# Altium footprint library PowerModule.PcbLib: 47 footprints (part 2 of 3)
Each footprint in its own frame and in the unit in brackets; x right, y up, seen from the top. Pads: shape width x height; smd on the part's side, far side on the other; paste and mask are expansions set on the pad; w line width, h text height; cw(c..) or ccw(c..) is an arc to the next point about the centre after c.
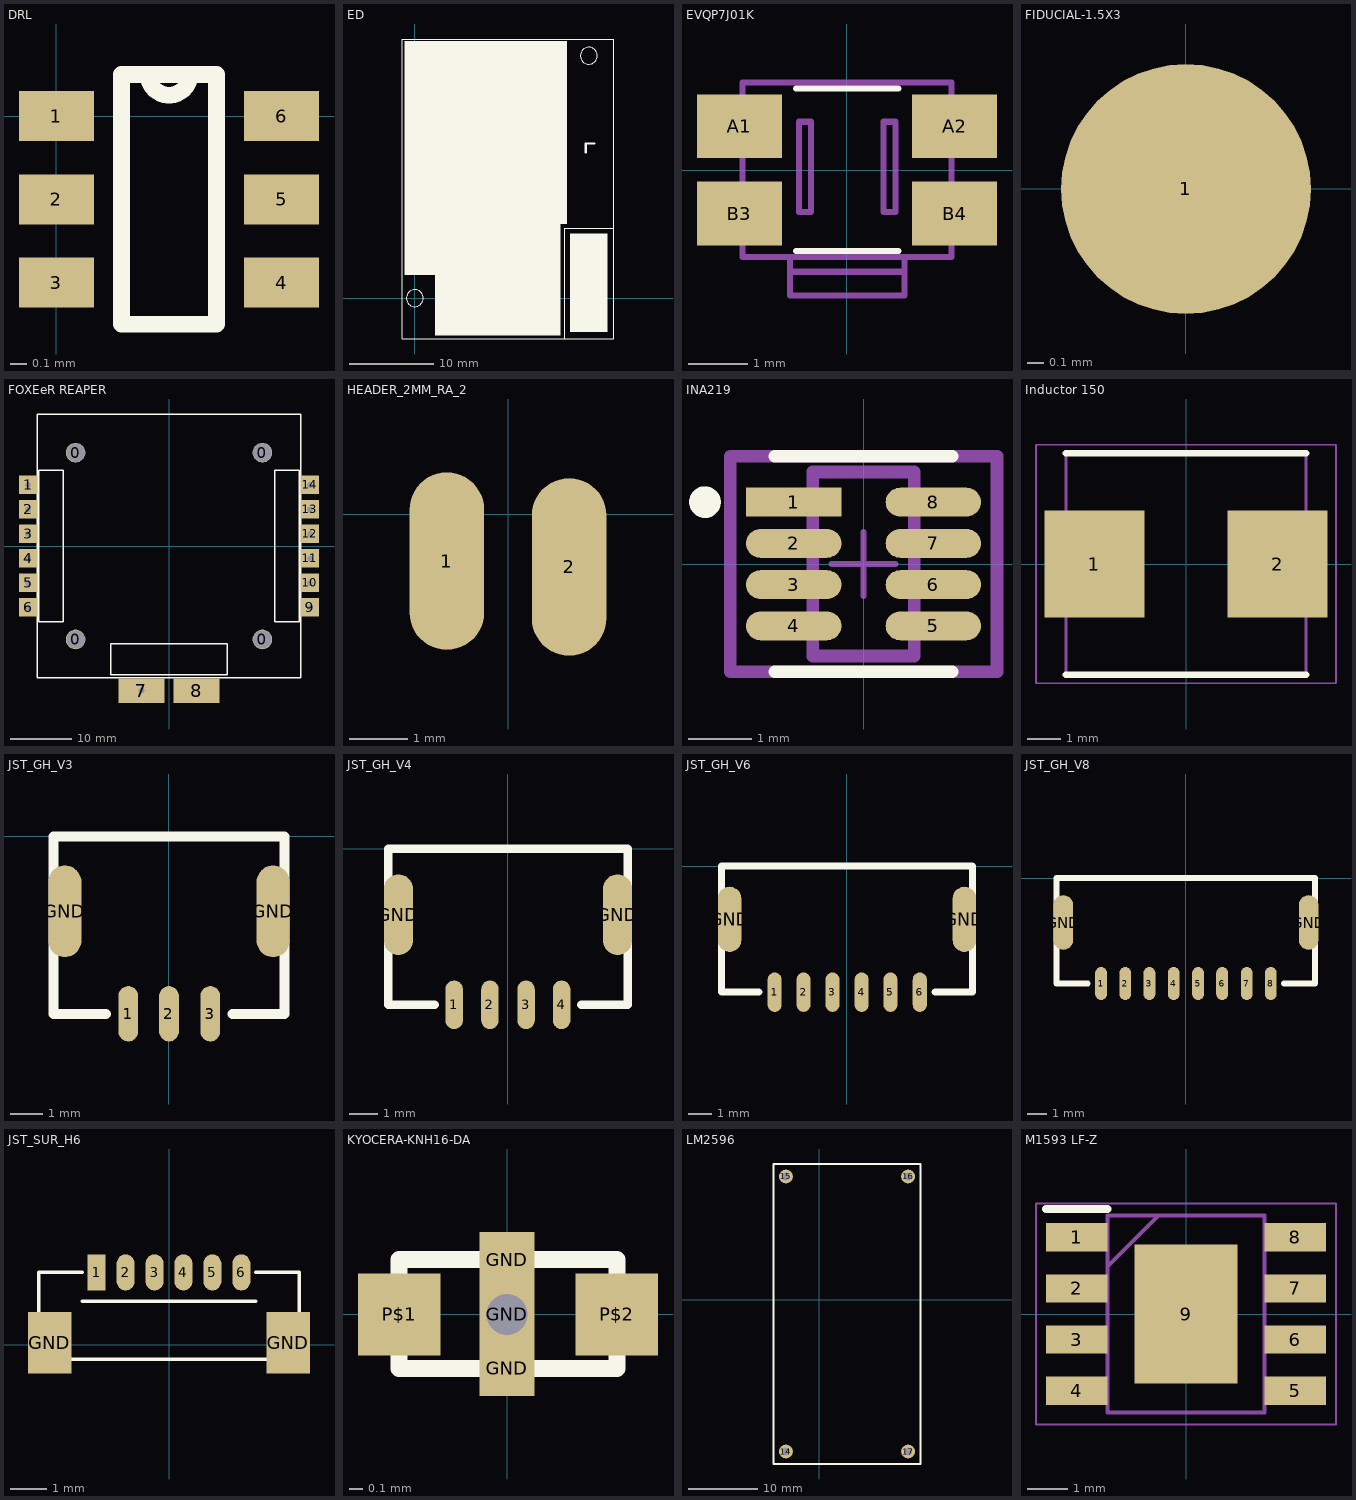
[diagram p1: the footprints below, top view; thin cyan lines are the x and y axes]

## DRL [mm]
pads (6):
  rect 0.45x0.3 smd: 1(0,0) 2(0,-0.5) 3(0,-1) 4(1.35,-1) 5(1.35,-0.5) 6(1.35,0)
Top Overlay:
  lines w0.1: 0.39,-1.25 0.96,-1.25 0.96,0.25 0.55,0.25 ccw(c0.675,0.25) 0.8,0.25 0.39,0.25 0.39,-1.25
3D body: height 0.6, standoff -0.05, extent 0.4,-1.2 1,0.2

## ED [mil]
Top Overlay:
  circle w3.94: c811.02,1129.53 r39.37
  circle w3.94: c0,0 r39.37
  region: -47.24,1196.85 -47.24,110.24 94.49,110.24 94.49,-173.23 677.17,-173.23 677.17,346.46 708.66,346.46 708.66,1196.85
  region: 724.41,299.21 897.64,299.21 897.64,-157.48 724.41,-157.48
  lines w3.94: 698.82,-190.16 698.82,325.98 922.36,325.98 ; -57.87,-190.16 926.38,-190.16 926.38,1207.48 -57.87,1207.48 -57.87,-190.16
  lines w10: 796.46,678.54 796.46,720.47 835.83,720.47

## EVQP7J01K [mil]
pads (4):
  rect 56x42 smd: A1(-70.87,29) A2(71,29) B3(-70.87,-28.54) B4(71,-28.54)
Top Overlay:
  lines w4: -82.68,20 -82.68,24 ; -33.46,-53.15 34,-53.15 ; -33.46,54 34,54
Mechanical 16:
  lines w4: -82.68,20 -70.87,20 ; -82.68,24 -90.55,24 -90.55,40 -70.87,40 ; -70.87,-39.37 -90.55,-39.37 -90.55,-23.62 -82.68,-23.62 -82.68,-19.68 -70.87,-19.68 ; 38,-66.93 -37.4,-66.93 ; 71,-39.37 91,-39.37 91,-23.62 83,-23.62 83,-19.68 71,-19.68 ; 71,20 83,20 83,24 91,24 91,40 71,40 ; -37.4,-66.93 -37.4,-82.68 38,-82.68 38,-57.09 ; -37.4,-66.93 -37.4,-57.09 ; -37.4,-57.09 -68.9,-57.09 -68.9,58 69,58 69,-57.09 38,-57.09 ; -37.4,-57.09 38,-57.09 ; -31.5,-27.56 -31.5,32 -23.62,32 -23.62,-27.56 -31.5,-27.56 ; 24,-27.56 24,32 32,32 32,-27.56 24,-27.56
3D body "EVQP7-JA-01P.STEP": height -62.99, standoff -116.14, extent -92.52,-82.68 92.52,57.09

## FIDUCIAL-1.5X3 [mil]
pads (1):
  rrect100% 60x60 smd paste-78.74: 1(0,0)
Top Solder:
  circle w50: c0,0 r36

## FOXEeR REAPER [mm] "_128K"
pads (18):
  round 3.2 hole 3: 0(-15.25,-15.25) 0(-15.25,15.25) 0(15.25,-15.25) 0(15.25,15.25)
  rect 3x3 hole 1: 1(-23,10) 2(-23,6) 3(-23,2) 4(-23,-2) 5(-23,-6) 6(-23,-10) 9(23,-10) 10(23,-6) 11(23,-2) 12(23,2) 13(23,6) 14(23,10)
  rect 7.5x4 hole 1: 7(-4.5,-23.6)
  rect 7.5x4 smd: 8(4.5,-23.6)
Top Overlay:
  lines w0.254: -21.5,-21.5 -21.5,21.5 21.5,21.5 21.5,-21.5 -21.5,-21.5 ; -21.25,-12.375 -21.25,12.375 -17.25,12.375 -17.25,-12.375 -21.25,-12.375 ; -9.5,-21 -9.5,-15.95 9.5,-15.95 9.5,-21 -9.5,-21 ; 17.25,-12.375 17.25,12.375 21.25,12.375 21.25,-12.375 17.25,-12.375
3D body "ESC Foxxer Reaper 60A v5.step": height 4.5, standoff 0, extent -20,-20.25 20,20.25

## HEADER_2MM_RA_2 [mil]
pads (2):
  rrect100% 50x119 smd: 1(-41.19,-31.46) 2(40.8,-35.39)

## INA219 [mm]
pads (8):
  rect 1.505x0.455 smd paste+0 mask+0: 1(-1.1,0.975)
  rrect100% 1.505x0.455 smd paste+0 mask+0: 2(-1.1,0.325) 3(-1.1,-0.325) 4(-1.1,-0.975) 5(1.1,-0.975) 6(1.1,-0.325) 7(1.1,0.325) 8(1.1,0.975)
Top Overlay:
  circle w0.25: c-2.5,0.975 r0.125
  lines w0.2: -1.4,-1.7 1.4,-1.7 ; -1.4,1.7 1.4,1.7
Top 3D Body:
  lines w0.2: -0.8,-1.45 -0.8,1.45 0.8,1.45 0.8,-1.45 -0.8,-1.45
Top Courtyard:
  lines w0.2: -2.103,-1.7 -2.103,1.7 2.103,1.7 2.103,-1.7 -2.103,-1.7
Top Assembly:
  lines w0.2: -2.103,-1.7 -2.103,1.7 2.103,1.7 2.103,-1.7 -2.103,-1.7
  text ".Designator" at 0,0.188 h1
Top Component Center:
  lines w0.1: -0.5,0 0.5,0 ; 0,-0.5 0,0.5
3D body "IC_Texas_Instruments_TLV3502AIDCNT_eec.STEP": height 0.25, standoff 0, extent -2.103,-1.7 2.103,1.7

## Inductor 150 [mm]
pads (2):
  rect 3x3.2 smd: 1(-2.75,0) 2(2.75,0)
Top Overlay:
  lines w0.2: -3.6,-3.325 3.6,-3.325 ; -3.6,3.325 3.6,3.325
Mechanical 15:
  lines w0.1: -3.6,-3.325 3.6,-3.325 3.6,3.325 -3.6,3.325 -3.6,-3.325
Mechanical 20:
  lines w0.05: -4.5,-3.575 4.5,-3.575 4.5,3.575 -4.5,3.575 -4.5,-3.575
3D body "ASPI-0630LR-150M-T15.stp": height 3, standoff 0, extent -3.6,-3.325 3.6,3.325

## JST_GH_V3 [mil]
pads (5):
  rrect100% 24x67 smd: 1(-49.21,-214.57) 2(0,-214.57) 3(50,-214.57)
  rrect100% 40x111 smd: GND(-125.98,-90.55) GND(126,-90.55)
Top Overlay:
  lines w12: -76.18,-214.57 -139.76,-214.57 -139.76,0 140,0 140,-214.57 77,-214.57
  text "." at -70,-225 h155
3D body "BM03B-GHS-TBT.STEP": height 164.56, standoff -0.8, extent -137.59,-234.88 138,-40

## JST_GH_V4 [mil]
pads (6):
  rrect100% 24x67 smd: 1(-73.82,-214.57) 2(-24.61,-214.57) 3(25,-214.57) 4(74,-214.57)
  rrect100% 40x111 smd: GND(-150.59,-90.55) GND(151,-90.55)
Top Overlay:
  lines w12: -100.79,-214.57 -164.37,-214.57 -164.37,0 165,0 165,-214.57 101,-214.57
  text "." at -95,-225 h155
3D body "BM04B-GHS-TBT.STEP": height 164.56, standoff -0.8, extent -161.8,-235.21 163,-40.33

## JST_GH_V6 [mil]
pads (8):
  rrect100% 24x67 smd: 1(-123.03,-214.57) 2(-73.82,-214.57) 3(-24.61,-214.57) 4(25,-214.57) 5(74,-214.57) 6(124,-214.57)
  rrect100% 40x111 smd: GND(-199.8,-90.55) GND(200,-90.55)
Top Overlay:
  lines w12: -150,-214.57 -213.58,-214.57 -213.58,0 214,0 214,-214.57 150,-214.57
  text "." at -145,-225 h155
3D body "BM06B-GHS-TBT.STEP": height 164.56, standoff -0.8, extent -211.61,-231.88 211.61,-37

## JST_GH_V8 [mil]
pads (10):
  rrect100% 24x67 smd: 1(-172.24,-214.57) 2(-123.03,-214.57) 3(-73.82,-214.57) 4(-24.61,-214.57) 5(25,-214.57) 6(74,-214.57) 7(124,-214.57) 8(173,-214.57)
  rrect100% 40x111 smd: GND(-249.02,-90.55) GND(250,-90.55)
Top Overlay:
  lines w12: -199.21,-214.57 -262.8,-214.57 -262.8,0 263,0 263,-214.57 200,-214.57
  text "." at -195,-225 h155
3D body "BM08B-GHS-TBT.STEP": height 164.56, standoff -0.8, extent -260.65,-233.88 261,-39

## JST_SUR_H6 [mm]
pads (8):
  rect 0.5x1 smd: 1(-2,2)
  rrect100% 0.5x1 smd: 2(-1.2,2) 3(-0.4,2) 4(0.4,2) 5(1.2,2) 6(2,2)
  rect 1.2x1.7 smd: GND(-3.3,0.05) GND(3.3,0.05)
Top Overlay:
  lines w0.1: -2.4,1.2 2.4,1.2 ; -2.4,2 -3.6,2 -3.6,-0.4 3.6,-0.4 3.6,2 2.4,2
  text "." at -2.4,2.8 h0.7
3D body "SM06B-SURS-TF.STEP": height 1.7, standoff -0.05, extent -3.5,-0.4 3.5,2.3

## KYOCERA-KNH16-DA [mil] "KYOCERA-KNH16-DA"
pads (5):
  rect 16x16 smd: GND(0,-15.75) GND(0,16)
  rect 16x16 hole 12: GND(0,0)
  rect 24x24 smd: P$1(-31.5,0) P$2(32,0)
Top Overlay:
  lines w5: -31.5,-15.75 32,-15.75 32,16 -31.5,16 -31.5,-15.75
3D body "KYOCERA-KNH16-DA.STEP": height 13.78, standoff 0, extent -19.68,-9.84 19.68,9.84

## LM2596 [mm]
pads (4):
  round 2 hole 1.1: 14(-4.804,-21.822) 15(-4.804,17.778) 16(12.796,17.778) 17(12.796,-21.822)
Top Overlay:
  lines w0.254: -6.604,-23.622 14.596,-23.622 14.596,19.578 -6.604,19.578 -6.604,-23.622
3D body "LM2596DCDC v5.step": height 11.5, standoff -2, extent -6.604,-23.622 14.596,19.578

## M1593 LF-Z [mm]
pads (9):
  rect 1.525x0.7 smd: 1(-2.712,1.905) 2(-2.712,0.635) 3(-2.712,-0.635) 4(-2.712,-1.905) 5(2.712,-1.905) 6(2.712,-0.635) 7(2.712,0.635) 8(2.712,1.905)
  rect 2.56x3.45 smd: 9(0,0)
Top Overlay:
  lines w0.2: -3.475,2.605 -1.95,2.605
Mechanical 15:
  lines w0.1: -1.95,1.18 -0.68,2.45 ; -1.95,-2.45 -1.95,2.45 1.95,2.45 1.95,-2.45 -1.95,-2.45
Mechanical 20:
  lines w0.05: -3.725,-2.75 -3.725,2.75 3.725,2.75 3.725,-2.75 -3.725,-2.75
3D body "MP1593DN-LF-Z.stp": height 1.7, standoff 0, extent -3,-2.45 3,2.45